# Altium footprint library cool_library.PcbLib: 1182 footprints (part 38 of 75)
Each footprint in its own frame and in the unit in brackets; x right, y up, seen from the top. Pads: shape width x height; smd on the part's side, far side on the other; paste and mask are expansions set on the pad; w line width, h text height; cw(c..) or ccw(c..) is an arc to the next point about the centre after c.
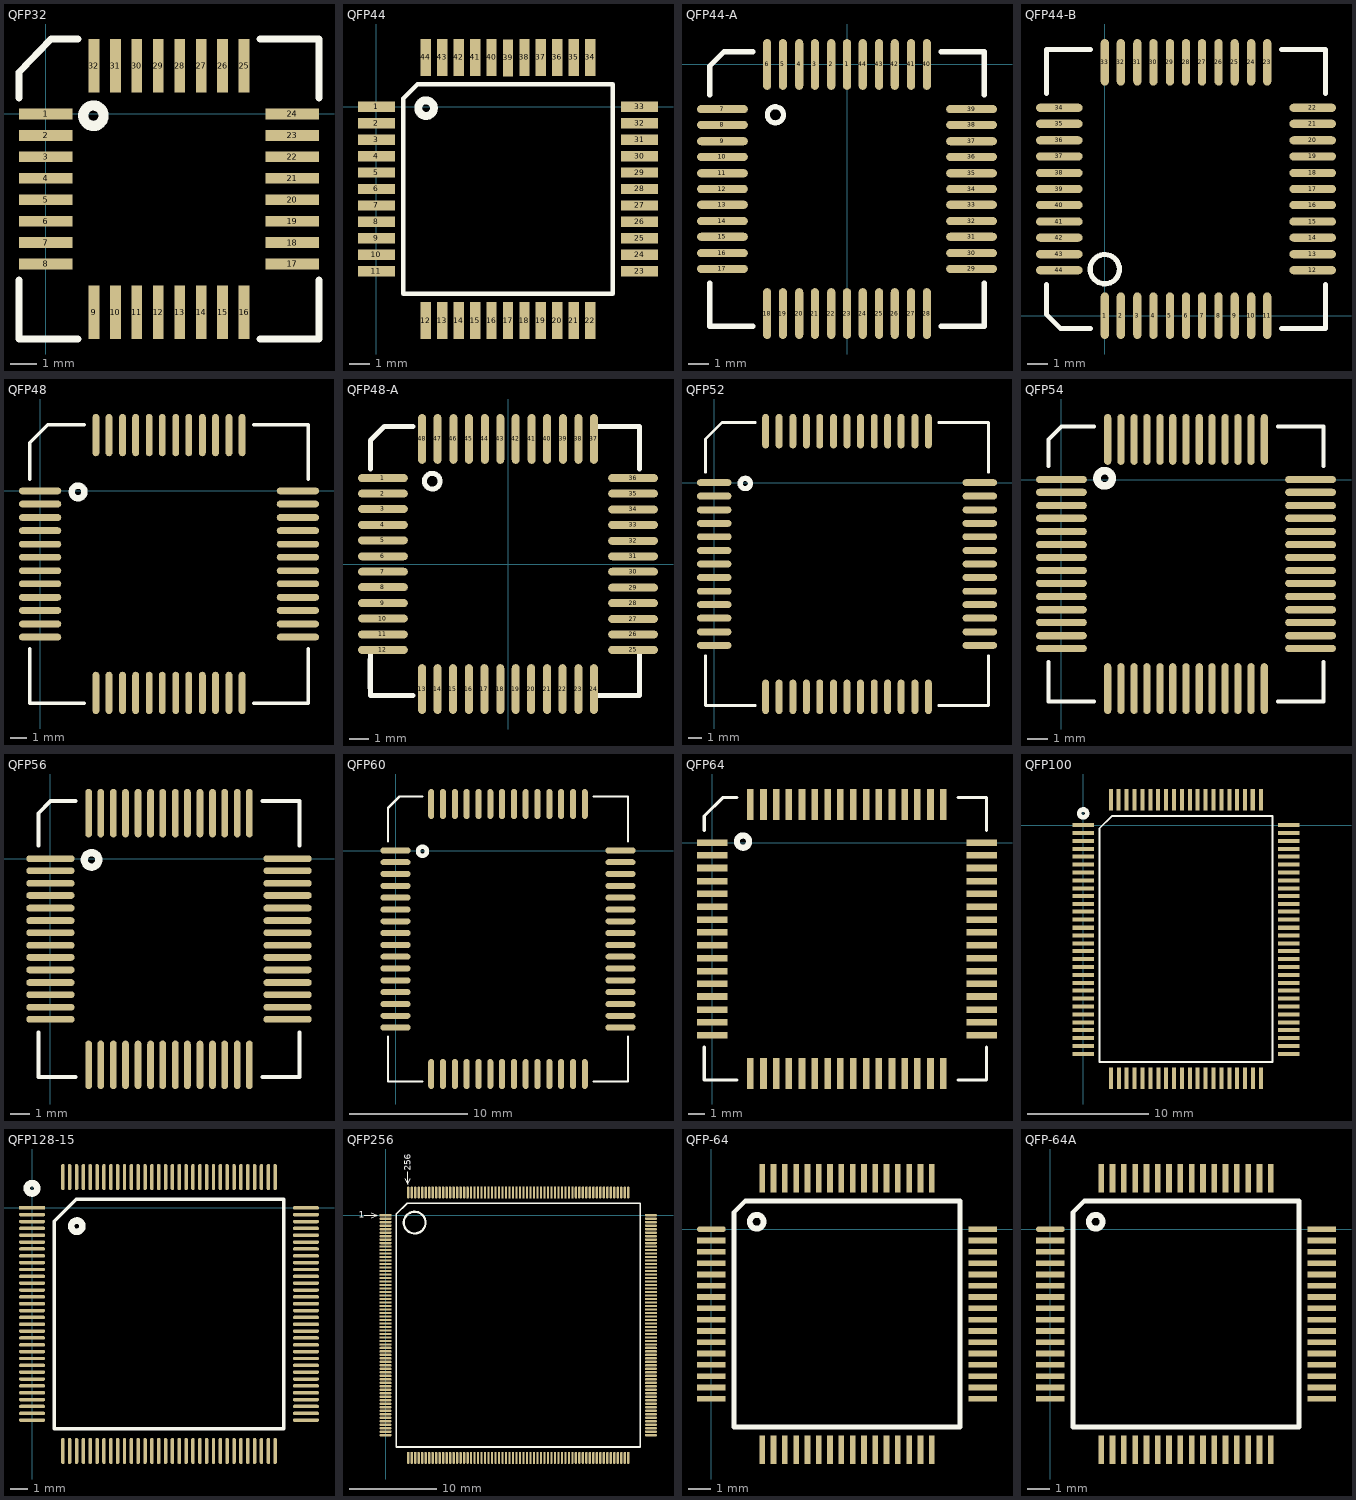
[diagram p37: the footprints below, top view; thin cyan lines are the x and y axes]

## QFP32 [mm]
pads (32):
  rect 2x0.4 smd: 1(0,0) 2(0,-0.8) 3(0,-1.6) 4(0,-2.4) 5(0,-3.2) 6(0,-4) 7(0,-4.8) 8(0,-5.6) 17(9.2,-5.6) 18(9.2,-4.8) 19(9.2,-4) 20(9.2,-3.2) 21(9.2,-2.4) 22(9.2,-1.6) 23(9.2,-0.8) 24(9.2,0)
  rect 0.4x2 smd: 9(1.8,-7.4) 10(2.6,-7.4) 11(3.4,-7.4) 12(4.2,-7.4) 13(5,-7.4) 14(5.8,-7.4) 15(6.6,-7.4) 16(7.4,-7.4) 25(7.4,1.8) 26(6.6,1.8) 27(5.8,1.8) 28(5,1.8) 29(4.2,1.8) 30(3.4,1.8) 31(2.6,1.8) 32(1.8,1.8)
Top Overlay:
  circle w0.381: c1.777,-0.063 r0.381
  lines w0.254: -1,-6.2 -1,-8.4 1.2,-8.4 ; -1,0.6 -1,1.556 0.19,2.8 1.2,2.8 ; 8,-8.4 10.2,-8.4 10.2,-6.2 ; 8,2.8 10.2,2.8 10.2,0.6

## QFP44 [mm]
pads (44):
  rect 1.8x0.5 smd: 1(0,0) 2(0,-0.8) 3(0,-1.6) 4(0,-2.4) 5(0,-3.2) 6(0,-4) 7(0,-4.8) 8(0,-5.6) 9(0,-6.4) 10(0,-7.2) 11(0,-8) 23(12.8,-8) 24(12.8,-7.2) 25(12.8,-6.4) 26(12.8,-5.6) 27(12.8,-4.8) 28(12.8,-4) 29(12.8,-3.2) 30(12.8,-2.4) 31(12.8,-1.6) 32(12.8,-0.8) 33(12.8,0)
  rect 0.5x1.8 smd: 12(2.4,-10.4) 13(3.2,-10.4) 14(4,-10.4) 15(4.8,-10.4) 16(5.6,-10.4) 17(6.4,-10.4) 18(7.2,-10.4) 19(8,-10.4) 20(8.8,-10.4) 21(9.6,-10.4) 22(10.4,-10.4) 34(10.4,2.4) 35(9.6,2.4) 36(8.8,2.4) 37(8,2.4) 38(7.2,2.4) 39(6.4,2.375) 40(5.6,2.4) 41(4.8,2.4) 42(4,2.4) 43(3.2,2.4) 44(2.4,2.4)
Top Overlay:
  circle w0.381: c2.412,-0.063 r0.381
  lines w0.203: 1.3,-9.1 1.3,0.411 1.989,1.1 11.5,1.1 11.5,-9.1 1.3,-9.1

## QFP44-A [mil]
pads (44):
  oval 16x100 smd: 1(0,0) 2(-31,0) 3(-63,0) 4(-94,0) 5(-126,0) 6(-157,0) 18(-157,-490) 19(-126,-490) 20(-94,-490) 21(-63,-490) 22(-31,-490) 23(0,-490) 24(31,-490) 25(63,-490) 26(94,-490) 27(126,-490) 28(157,-490) 40(157,0) 41(126,0) 42(94,0) 43(63,0) 44(31,0)
  oval 100x16 smd: 7(-245,-88) 8(-245,-119) 9(-245,-151) 10(-245,-182) 11(-245,-214) 12(-245,-245) 13(-245,-276) 14(-245,-308) 15(-245,-339) 16(-245,-371) 17(-245,-402) 29(245,-402) 30(245,-371) 31(245,-339) 32(245,-308) 33(245,-276) 34(245,-245) 35(245,-214) 36(245,-182) 37(245,-151) 38(245,-119) 39(245,-88)
Top Overlay:
  circle w10: c-140.81,-99 r15.81
  lines w10: -270,-430 -270,-515 -185,-515 ; -270,-60 -270,-3 -242,25 -185,25 ; 185,-515 270,-515 270,-430 ; 185,25 270,25 270,-60

## QFP44-B [mil]
pads (44):
  oval 16x90 smd: 1(0,0) 2(31,0) 3(63,0) 4(94,0) 5(126,0) 6(157,0) 7(188,0) 8(220,0) 9(251,0) 10(283,0) 11(314,0) 23(314,490) 24(283,490) 25(251,490) 26(220,490) 27(188,490) 28(157,490) 29(126,490) 30(94,490) 31(63,490) 32(31,490) 33(0,490)
  oval 90x16 smd: 12(402,88) 13(402,119) 14(402,151) 15(402,182) 16(402,214) 17(402,245) 18(402,276) 19(402,308) 20(402,339) 21(402,371) 22(402,402) 34(-88,402) 35(-88,371) 36(-88,339) 37(-88,308) 38(-88,276) 39(-88,245) 40(-88,214) 41(-88,182) 42(-88,151) 43(-88,119) 44(-88,88)
Top Overlay:
  circle w10: c0,90 r28.28
  lines w10: -113,60 -113,3 -85,-25 -28,-25 ; -113,430 -113,515 -28,515 ; 342,-25 427,-25 427,60 ; 342,515 427,515 427,430

## QFP48 [mil]
pads (48):
  oval 100x16 smd: 1(0,0) 2(0,-31) 3(0,-63) 4(0,-94) 5(0,-126) 6(0,-157) 7(0,-189) 8(0,-220) 9(0,-252) 10(0,-283) 11(0,-315) 12(0,-346) 25(610,-346) 26(610,-315) 27(610,-283) 28(610,-252) 29(610,-220) 30(610,-189) 31(610,-157) 32(610,-126) 33(610,-94) 34(610,-63) 35(610,-31) 36(610,0)
  oval 16x100 smd: 13(132,-478) 14(163,-478) 15(195,-478) 16(226,-478) 17(258,-478) 18(289,-478) 19(321,-478) 20(352,-478) 21(384,-478) 22(415,-478) 23(447,-478) 24(478,-478) 37(478,132) 38(447,132) 39(415,132) 40(384,132) 41(352,132) 42(321,132) 43(289,132) 44(258,132) 45(226,132) 46(195,132) 47(163,132) 48(132,132)
Top Overlay:
  circle w15: c89.97,-2.48 r15
  lines w8: -25,-374 -25,-503 104,-503 ; -25,28 -25,114 18,157 104,157 ; 506,-503 635,-503 635,-374 ; 506,157 635,157 635,28

## QFP48-A [mil]
pads (48):
  oval 100x16 smd: 1(-251.24,172.5) 2(-251.24,141.5) 3(-251.24,110.5) 4(-251.24,78.5) 5(-251.24,47.5) 6(-251.24,15.5) 7(-251.24,-15.5) 8(-251.24,-46.5) 9(-251.24,-78.5) 10(-251.24,-109.5) 11(-251.24,-141.5) 12(-251.24,-172.5) 25(251.24,-172.5) 26(251.24,-141.5) 27(251.24,-110.5) 28(251.24,-78.5) 29(251.24,-47.5) 30(251.24,-15.5) 31(251.24,15.5) 32(251.24,46.5) 33(251.24,78.5) 34(251.24,109.5) 35(251.24,141.5) 36(251.24,172.5)
  oval 16x100 smd: 13(-172.5,-251.24) 14(-141.5,-251.24) 15(-110.5,-251.24) 16(-78.5,-251.24) 17(-47.5,-251.24) 18(-15.5,-251.24) 19(15.5,-251.24) 20(46.5,-251.24) 21(78.5,-251.24) 22(109.5,-251.24) 23(141.5,-251.24) 24(172.5,-251.24) 37(172.5,251.24) 38(141.5,251.24) 39(110.5,251.24) 40(78.5,251.24) 41(47.5,251.24) 42(15.5,251.24) 43(-15.5,251.24) 44(-46.5,251.24) 45(-78.5,251.24) 46(-109.5,251.24) 47(-141.5,251.24) 48(-172.5,251.24)
Top Overlay:
  circle w10: c-152.05,166.24 r15.81
  lines w10: -276.24,-178.76 -276.24,-263.76 -191.24,-263.76 ; 178.76,-263.76 263.76,-263.76 263.76,-178.76 ; 178.76,276.24 263.76,276.24 263.76,191.24 ; -276.24,248.24 -276.24,191.24 -276.24,248.24 ; -276.24,248.24 -248.24,276.24 ; -248.24,276.24 -191.24,276.24 -248.24,276.24 ; -276.98,-248.76 -276.98,-191.76 -276.98,-248.76

## QFP52 [mil]
pads (52):
  oval 100x20 smd: 1(0,0) 2(0,-39) 3(0,-79) 4(0,-118) 5(0,-157) 6(0,-197) 7(0,-236) 8(0,-275) 9(0,-315) 10(0,-354) 11(0,-393) 12(0,-433) 13(0,-472) 27(770,-472) 28(770,-433) 29(770,-393) 30(770,-354) 31(770,-315) 32(770,-275) 33(770,-236) 34(770,-197) 35(770,-157) 36(770,-118) 37(770,-79) 38(770,-39) 39(770,0)
  oval 20x100 smd: 14(149,-621) 15(188,-621) 16(228,-621) 17(267,-621) 18(306,-621) 19(346,-621) 20(385,-621) 21(424,-621) 22(464,-621) 23(503,-621) 24(542,-621) 25(582,-621) 26(621,-621) 40(621,149) 41(582,149) 42(542,149) 43(503,149) 44(464,149) 45(424,149) 46(385,149) 47(346,149) 48(306,149) 49(267,149) 50(228,149) 51(188,149) 52(149,149)
Top Overlay:
  circle w15: c89.97,-2.48 r15
  lines w8: -25,-502 -25,-646 119,-646 ; -25,30 -25,126 23,174 119,174 ; 651,-646 795,-646 795,-502 ; 651,174 795,174 795,30

## QFP54 [mil]
pads (54):
  oval 100x14 smd: 1(0,0) 2(0,-25) 3(0,-51) 4(0,-76) 5(0,-102) 6(0,-128) 7(0,-153) 8(0,-179) 9(0,-204) 10(0,-230) 11(0,-256) 12(0,-281) 13(0,-307) 14(0,-332) 28(490,-332) 29(490,-307) 30(490,-281) 31(490,-256) 32(490,-230) 33(490,-204) 34(490,-179) 35(490,-153) 36(490,-128) 37(490,-102) 38(490,-76) 39(490,-51) 40(490,-25) 41(490,0)
  oval 14x100 smd: 15(91,-411) 16(117,-411) 17(143,-411) 18(168,-411) 19(194,-411) 20(219,-411) 21(245,-411) 22(271,-411) 23(296,-411) 24(322,-411) 25(347,-411) 26(373,-411) 27(399,-411) 42(399,79) 43(373,79) 44(347,79) 45(322,79) 46(296,79) 47(271,79) 48(245,79) 49(219,79) 50(194,79) 51(168,79) 52(143,79) 53(117,79) 54(91,79)
Top Overlay:
  circle w15: c84.97,2.52 r15
  lines w8: -25,-359 -25,-436 64,-436 ; -25,27 -25,79 0,104 64,104 ; 426,-436 515,-436 515,-359 ; 426,104 515,104 515,27

## QFP56 [mil]
pads (56):
  oval 100x14 smd: 1(0,0) 2(0,-25) 3(0,-51) 4(0,-76) 5(0,-102) 6(0,-128) 7(0,-153) 8(0,-179) 9(0,-204) 10(0,-230) 11(0,-256) 12(0,-281) 13(0,-307) 14(0,-332) 29(490,-332) 30(490,-307) 31(490,-281) 32(490,-256) 33(490,-230) 34(490,-204) 35(490,-179) 36(490,-153) 37(490,-128) 38(490,-102) 39(490,-76) 40(490,-51) 41(490,-25) 42(490,0)
  oval 14x100 smd: 15(79,-426) 16(104,-426) 17(130,-426) 18(155,-426) 19(181,-426) 20(207,-426) 21(232,-426) 22(258,-426) 23(283,-426) 24(309,-426) 25(335,-426) 26(360,-426) 27(386,-426) 28(411,-426) 43(411,94) 44(386,94) 45(360,94) 46(335,94) 47(309,94) 48(283,94) 49(258,94) 50(232,94) 51(207,94) 52(181,94) 53(155,94) 54(130,94) 55(104,94) 56(79,94)
Top Overlay:
  circle w15: c84.97,-2.48 r15
  lines w8: -25,-359 -25,-451 52,-451 ; -25,27 -25,94 0,119 52,119 ; 438,-451 515,-451 515,-359 ; 438,119 515,119 515,27

## QFP60 [mil]
pads (60):
  oval 100x20 smd: 1(0,0) 2(0,-39) 3(0,-78) 4(0,-118) 5(0,-157) 6(0,-197) 7(0,-236) 8(0,-275) 9(0,-315) 10(0,-354) 11(0,-393) 12(0,-433) 13(0,-472) 14(0,-512) 15(0,-551) 16(0,-590) 31(750,-590) 32(750,-551) 33(750,-512) 34(750,-472) 35(750,-433) 36(750,-393) 37(750,-354) 38(750,-315) 39(750,-275) 40(750,-236) 41(750,-197) 42(750,-157) 43(750,-118) 44(750,-78) 45(750,-39) 46(750,0)
  oval 20x100 smd: 17(119,-745) 18(158,-745) 19(198,-745) 20(237,-745) 21(277,-745) 22(316,-745) 23(355,-745) 24(395,-745) 25(434,-745) 26(473,-745) 27(513,-745) 28(552,-745) 29(592,-745) 30(631,-745) 47(631,155) 48(592,155) 49(552,155) 50(513,155) 51(473,155) 52(434,155) 53(395,155) 54(355,155) 55(316,155) 56(277,155) 57(237,155) 58(198,155) 59(158,155) 60(119,155)
Top Overlay:
  circle w15: c89.97,-2.48 r15
  lines w8: -25,-620 -25,-770 89,-770 ; -25,30 -25,142 13,180 89,180 ; 661,-770 775,-770 775,-620 ; 661,180 775,180 775,30

## QFP64 [mil]
pads (64):
  rect 75x16 smd: 1(0,0) 2(0,-31) 3(0,-62) 4(0,-94) 5(0,-125) 6(0,-157) 7(0,-188) 8(0,-219) 9(0,-251) 10(0,-282) 11(0,-314) 12(0,-345) 13(0,-376) 14(0,-408) 15(0,-439) 16(0,-471) 33(658,-471) 34(658,-439) 35(658,-408) 36(658,-376) 37(658,-345) 38(658,-314) 39(658,-282) 40(658,-251) 41(658,-219) 42(658,-188) 43(658,-157) 44(658,-125) 45(658,-94) 46(658,-62) 47(658,-31) 48(658,0)
  rect 16x75 smd: 17(93,-564) 18(125,-564) 19(156,-564) 20(187,-564) 21(219,-564) 22(250,-564) 23(282,-564) 24(313,-564) 25(344,-564) 26(376,-564) 27(407,-564) 28(439,-564) 29(470,-564) 30(501,-564) 31(533,-564) 32(564,-564) 49(564,93) 50(533,93) 51(501,93) 52(470,93) 53(439,93) 54(407,93) 55(376,93) 56(344,93) 57(313,93) 58(282,93) 59(250,93) 60(219,93) 61(187,93) 62(156,93) 63(125,93) 64(93,93)
Top Overlay:
  circle w15: c74.97,2.52 r15
  lines w8: -20,-500 -20,-580 60,-580 ; -20,30 -20,65 25,110 60,110 ; 600,-580 670,-580 670,-500 ; 600,110 670,110 670,30

## QFP100 [mil]
pads (100):
  rect 70x13 smd: 1(0,0) 2(0,-26) 3(0,-51) 4(0,-77) 5(0,-102) 6(0,-128) 7(0,-154) 8(0,-179) 9(0,-205) 10(0,-230) 11(0,-256) 12(0,-281) 13(0,-307) 14(0,-333) 15(0,-358) 16(0,-384) 17(0,-409) 18(0,-435) 19(0,-461) 20(0,-486) 21(0,-512) 22(0,-537) 23(0,-563) 24(0,-589) 25(0,-614) 26(0,-640) 27(0,-665) 28(0,-691) 29(0,-717) 30(0,-742) 51(667,-742) 52(667,-717) 53(667,-691) 54(667,-665) 55(667,-640) 56(667,-614) 57(667,-589) 58(667,-563) 59(667,-537) 60(667,-512) 61(667,-486) 62(667,-461) 63(667,-435) 64(667,-409) 65(667,-384) 66(667,-358) 67(667,-333) 68(667,-307) 69(667,-281) 70(667,-256) 71(667,-230) 72(667,-205) 73(667,-179) 74(667,-154) 75(667,-128) 76(667,-102) 77(667,-77) 78(667,-51) 79(667,-26) 80(667,0)
  rect 13x70 smd: 31(90,-821) 32(116,-821) 33(141,-821) 34(167,-821) 35(192,-821) 36(218,-821) 37(244,-821) 38(269,-821) 39(295,-821) 40(320,-821) 41(346,-821) 42(371,-821) 43(397,-821) 44(423,-821) 45(448,-821) 46(474,-821) 47(499,-821) 48(525,-821) 49(551,-821) 50(576,-821) 81(576,82) 82(550,82) 83(525,82) 84(499,82) 85(474,82) 86(448,82) 87(422,82) 88(397,82) 89(371,82) 90(346,82) 91(320,82) 92(295,82) 93(269,82) 94(243,82) 95(218,82) 96(192,82) 97(167,82) 98(141,82) 99(115,82) 100(90,82)
Top Overlay:
  circle w15: c0,38 r12.81
  lines w6: 614,-768 53,-768 53,-11 93,29 614,29 ; 614.05,-768.05 614.05,29.05

## QFP128-15 [mil]
pads (128):
  rect 60x8 smd: 1(0,0)
  oval 60x8 smd: 2(0,-15.75) 3(0,-31.5) 4(0,-47.24) 5(0,-62.99) 6(0,-78.74) 7(0,-94.49) 8(0,-110.24) 9(0,-125.98) 10(0,-141.73) 11(0,-157.48) 12(0,-173.23) 13(0,-188.98) 14(0,-204.72) 15(0,-220.47) 16(0,-236.22) 17(0,-251.97) 18(0,-267.72) 19(0,-283.46) 20(0,-299.21) 21(0,-314.96) 22(0,-330.71) 23(0,-346.46) 24(0,-362.2) 25(0,-377.95) 26(0,-393.7) 27(0,-409.45) 28(0,-425.2) 29(0,-440.94) 30(0,-456.69) 31(0,-472.44) 32(0,-488.19) 65(629.92,-488.19) 66(629.92,-472.44) 67(629.92,-456.69) 68(629.92,-440.94) 69(629.92,-425.2) 70(629.92,-409.45) 71(629.92,-393.7) 72(629.92,-377.95) 73(629.92,-362.2) 74(629.92,-346.46) 75(629.92,-330.71) 76(629.92,-314.96) 77(629.92,-299.21) 78(629.92,-283.46) 79(629.92,-267.72) 80(629.92,-251.97) 81(629.92,-236.22) 82(629.92,-220.47) 83(629.92,-204.72) 84(629.92,-188.98) 85(629.92,-173.23) 86(629.92,-157.48) 87(629.92,-141.73) 88(629.92,-125.98) 89(629.92,-110.24) 90(629.92,-94.49) 91(629.92,-78.74) 92(629.92,-62.99) 93(629.92,-47.24) 94(629.92,-31.5) 95(629.92,-15.75) 96(629.92,0)
  oval 8x60 smd: 33(70.87,-559.05) 34(86.61,-559.05) 35(102.36,-559.05) 36(118.11,-559.05) 37(133.86,-559.05) 38(149.61,-559.05) 39(165.35,-559.05) 40(181.1,-559.05) 41(196.85,-559.05) 42(212.6,-559.05) 43(228.35,-559.05) 44(244.09,-559.05) 45(259.84,-559.05) 46(275.59,-559.05) 47(291.34,-559.05) 48(307.09,-559.05) 49(322.83,-559.05) 50(338.58,-559.05) 51(354.33,-559.05) 52(370.08,-559.05) 53(385.83,-559.05) 54(401.57,-559.05) 55(417.32,-559.05) 56(433.07,-559.05) 57(448.82,-559.05) 58(464.57,-559.05) 59(480.31,-559.05) 60(496.06,-559.05) 61(511.81,-559.05) 62(527.56,-559.05) 63(543.31,-559.05) 64(559.05,-559.05) 97(559.05,70.87) 98(543.31,70.87) 99(527.56,70.87) 100(511.81,70.87) 101(496.06,70.87) 102(480.31,70.87) 103(464.57,70.87) 104(448.82,70.87) 105(433.07,70.87) 106(417.32,70.87) 107(401.57,70.87) 108(385.83,70.87) 109(370.08,70.87) 110(354.33,70.87) 111(338.58,70.87) 112(322.83,70.87) 113(307.09,70.87) 114(291.34,70.87) 115(275.59,70.87) 116(259.84,70.87) 117(244.09,70.87) 118(228.35,70.87) 119(212.6,70.87) 120(196.85,70.87) 121(181.1,70.87) 122(165.35,70.87) 123(149.61,70.87) 124(133.86,70.87) 125(118.11,70.87) 126(102.36,70.87) 127(86.61,70.87) 128(70.87,70.87)
Top Overlay:
  circle w15: c-0.03,45 r12.01
  circle w15: c102.97,-42 r12.97
  lines w7.87: 50.59,-508.46 50.59,-30.31 101.18,20.28 579.33,20.28 579.33,-508.46 50.59,-508.46

## QFP256 [mm]
pads (256):
  rect 1.4x0.26 smd: 1(0,0)
  oval 1.4x0.26 smd: 2(0,-0.4) 3(0,-0.8) 4(0,-1.2) 5(0,-1.6) 6(0,-2) 7(0,-2.4) 8(0,-2.8) 9(0,-3.2) 10(0,-3.6) 11(0,-4) 12(0,-4.4) 13(0,-4.8) 14(0,-5.2) 15(0,-5.6) 16(0,-6) 17(0,-6.4) 18(0,-6.8) 19(0,-7.2) 20(0,-7.6) 21(0,-8) 22(0,-8.4) 23(0,-8.8) 24(0,-9.2) 25(0,-9.6) 26(0,-10) 27(0,-10.4) 28(0,-10.8) 29(0,-11.2) 30(0,-11.6) 31(0,-12) 32(0,-12.4) 33(0,-12.8) 34(0,-13.2) 35(0,-13.6) 36(0,-14) 37(0,-14.4) 38(0,-14.8) 39(0,-15.2) 40(0,-15.6) 41(0,-16) 42(0,-16.4) 43(0,-16.8) 44(0,-17.2) 45(0,-17.6) 46(0,-18) 47(0,-18.4) 48(0,-18.8) 49(0,-19.2) 50(0,-19.6) 51(0,-20) 52(0,-20.4) 53(0,-20.8) 54(0,-21.2) 55(0,-21.6) 56(0,-22) 57(0,-22.4) 58(0,-22.8) 59(0,-23.2) 60(0,-23.6) 61(0,-24) 62(0,-24.4) 63(0,-24.8) 64(0,-25.2) 129(30.4,-25.2) 130(30.4,-24.8) 131(30.4,-24.4) 132(30.4,-24) 133(30.4,-23.6) 134(30.4,-23.2) 135(30.4,-22.8) 136(30.4,-22.4) 137(30.4,-22) 138(30.4,-21.6) 139(30.4,-21.2) 140(30.4,-20.8) 141(30.4,-20.4) 142(30.4,-20) 143(30.4,-19.6) 144(30.4,-19.2) 145(30.4,-18.8) 146(30.4,-18.4) 147(30.4,-18) 148(30.4,-17.6) 149(30.4,-17.2) 150(30.4,-16.8) 151(30.4,-16.4) 152(30.4,-16) 153(30.4,-15.6) 154(30.4,-15.2) 155(30.4,-14.8) 156(30.4,-14.4) 157(30.4,-14) 158(30.4,-13.6) 159(30.4,-13.2) 160(30.4,-12.8) 161(30.4,-12.4) 162(30.4,-12) 163(30.4,-11.6) 164(30.4,-11.2) 165(30.4,-10.8) 166(30.4,-10.4) 167(30.4,-10) 168(30.4,-9.6) 169(30.4,-9.2) 170(30.4,-8.8) 171(30.4,-8.4) 172(30.4,-8) 173(30.4,-7.6) 174(30.4,-7.2) 175(30.4,-6.8) 176(30.4,-6.4) 177(30.4,-6) 178(30.4,-5.6) 179(30.4,-5.2) 180(30.4,-4.8) 181(30.4,-4.4) 182(30.4,-4) 183(30.4,-3.6) 184(30.4,-3.2) 185(30.4,-2.8) 186(30.4,-2.4) 187(30.4,-2) 188(30.4,-1.6) 189(30.4,-1.2) 190(30.4,-0.8) 191(30.4,-0.4) 192(30.4,0)
  oval 0.26x1.4 smd: 65(2.6,-27.8) 66(3,-27.8) 67(3.4,-27.8) 68(3.8,-27.8) 69(4.2,-27.8) 70(4.6,-27.8) 71(5,-27.8) 72(5.4,-27.8) 73(5.8,-27.8) 74(6.2,-27.8) 75(6.6,-27.8) 76(7,-27.8) 77(7.4,-27.8) 78(7.8,-27.8) 79(8.2,-27.8) 80(8.6,-27.8) 81(9,-27.8) 82(9.4,-27.8) 83(9.8,-27.8) 84(10.2,-27.8) 85(10.6,-27.8) 86(11,-27.8) 87(11.4,-27.8) 88(11.8,-27.8) 89(12.2,-27.8) 90(12.6,-27.8) 91(13,-27.8) 92(13.4,-27.8) 93(13.8,-27.8) 94(14.2,-27.8) 95(14.6,-27.8) 96(15,-27.8) 97(15.4,-27.8) 98(15.8,-27.8) 99(16.2,-27.8) 100(16.6,-27.8) 101(17,-27.8) 102(17.4,-27.8) 103(17.8,-27.8) 104(18.2,-27.8) 105(18.6,-27.8) 106(19,-27.8) 107(19.4,-27.8) 108(19.8,-27.8) 109(20.2,-27.8) 110(20.6,-27.8) 111(21,-27.8) 112(21.4,-27.8) 113(21.8,-27.8) 114(22.2,-27.8) 115(22.6,-27.8) 116(23,-27.8) 117(23.4,-27.8) 118(23.8,-27.8) 119(24.2,-27.8) 120(24.6,-27.8) 121(25,-27.8) 122(25.4,-27.8) 123(25.8,-27.8) 124(26.2,-27.8) 125(26.6,-27.8) 126(27,-27.8) 127(27.4,-27.8) 128(27.8,-27.8) 193(27.8,2.6) 194(27.4,2.6) 195(27,2.6) 196(26.6,2.6) 197(26.2,2.6) 198(25.8,2.6) 199(25.4,2.6) 200(25,2.6) 201(24.6,2.6) 202(24.2,2.6) 203(23.8,2.6) 204(23.4,2.6) 205(23,2.6) 206(22.6,2.6) 207(22.2,2.6) 208(21.8,2.6) 209(21.4,2.6) 210(21,2.6) 211(20.6,2.6) 212(20.2,2.6) 213(19.8,2.6) 214(19.4,2.6) 215(19,2.6) 216(18.6,2.6) 217(18.2,2.6) 218(17.8,2.6) 219(17.4,2.6) 220(17,2.6) 221(16.6,2.6) 222(16.2,2.6) 223(15.8,2.6) 224(15.4,2.6) 225(15,2.6) 226(14.6,2.6) 227(14.2,2.6) 228(13.8,2.6) 229(13.4,2.6) 230(13,2.6) 231(12.6,2.6) 232(12.2,2.6) 233(11.8,2.6) 234(11.4,2.6) 235(11,2.6) 236(10.6,2.6) 237(10.2,2.6) 238(9.8,2.6) 239(9.4,2.6) 240(9,2.6) 241(8.6,2.6) 242(8.2,2.6) 243(7.8,2.6) 244(7.4,2.6) 245(7,2.6) 246(6.6,2.6) 247(6.2,2.6) 248(5.8,2.6) 249(5.4,2.6) 250(5,2.6) 251(4.6,2.6) 252(4.2,2.6) 253(3.8,2.6) 254(3.4,2.6) 255(3,2.6) 256(2.6,2.6)
Top Overlay:
  circle w0.254: c3.333,-0.85 r1.247
  lines w0.127: -2.44,0 -0.97,0 ; -1.62,-0.32 -0.97,0 ; -1.62,0.29 -0.97,0 ; 2.22,4.18 2.54,3.53 ; 2.54,5 2.54,3.53 ; 2.83,4.18 2.54,3.53
  lines w0.2: 1.235,-26.565 29.165,-26.565 29.165,1.365 2.47,1.365 1.235,0.13 1.235,-26.565
  text "1" at -3.05,-0.32 h0.76
  text "256" at 2.91,5.1 h0.76

## QFP-64 [mil]
pads (64):
  oval 50x10 smd: 1(0,0)
  rect 50x10 smd: 2(0,-19.69) 3(0,-39.37) 4(0,-59.06) 5(0,-78.74) 6(0,-98.43) 7(0,-118.11) 8(0,-137.8) 9(0,-157.48) 10(0,-177.17) 11(0,-196.85) 12(0,-216.54) 13(0,-236.22) 14(0,-255.91) 15(0,-275.59) 16(0,-295.28) 33(472.44,-295.28) 34(472.44,-275.59) 35(472.44,-255.91) 36(472.44,-236.22) 37(472.44,-216.54) 38(472.44,-196.85) 39(472.44,-177.17) 40(472.44,-157.48) 41(472.44,-137.8) 42(472.44,-118.11) 43(472.44,-98.43) 44(472.44,-78.74) 45(472.44,-59.06) 46(472.44,-39.37) 47(472.44,-19.69) 48(472.44,0)
  rect 10x50 smd: 17(88.58,-383.86) 18(108.27,-383.86) 19(127.95,-383.86) 20(147.64,-383.86) 21(167.32,-383.86) 22(187.01,-383.86) 23(206.69,-383.86) 24(226.38,-383.86) 25(246.06,-383.86) 26(265.75,-383.86) 27(285.43,-383.86) 28(305.12,-383.86) 29(324.8,-383.86) 30(344.49,-383.86) 31(364.17,-383.86) 32(383.86,-383.86) 49(383.86,88.58) 50(364.17,88.58) 51(344.49,88.58) 52(324.8,88.58) 53(305.12,88.58) 54(285.43,88.58) 55(265.75,88.58) 56(246.06,88.58) 57(226.38,88.58) 58(206.69,88.58) 59(187.01,88.58) 60(167.32,88.58) 61(147.64,88.58) 62(127.95,88.58) 63(108.27,88.58) 64(88.58,88.58)
Top Overlay:
  circle w10: c78.96,13 r12.04
  lines w8: 39.37,-344.49 433.07,-344.49 433.07,49.21 59.05,49.21 39.37,29.53 39.37,-344.49

## QFP-64A [mil]
pads (64):
  oval 50x10 smd: 1(0,0)
  rect 50x10 smd: 2(0,-19.69) 3(0,-39.37) 4(0,-59.06) 5(0,-78.74) 6(0,-98.43) 7(0,-118.11) 8(0,-137.8) 9(0,-157.48) 10(0,-177.17) 11(0,-196.85) 12(0,-216.54) 13(0,-236.22) 14(0,-255.91) 15(0,-275.59) 16(0,-295.28) 33(472.44,-295.28) 34(472.44,-275.59) 35(472.44,-255.91) 36(472.44,-236.22) 37(472.44,-216.54) 38(472.44,-196.85) 39(472.44,-177.17) 40(472.44,-157.48) 41(472.44,-137.8) 42(472.44,-118.11) 43(472.44,-98.43) 44(472.44,-78.74) 45(472.44,-59.06) 46(472.44,-39.37) 47(472.44,-19.69) 48(472.44,0)
  rect 10x50 smd: 17(88.58,-383.86) 18(108.27,-383.86) 19(127.95,-383.86) 20(147.64,-383.86) 21(167.32,-383.86) 22(187.01,-383.86) 23(206.69,-383.86) 24(226.38,-383.86) 25(246.06,-383.86) 26(265.75,-383.86) 27(285.43,-383.86) 28(305.12,-383.86) 29(324.8,-383.86) 30(344.49,-383.86) 31(364.17,-383.86) 32(383.86,-383.86) 49(383.86,88.58) 50(364.17,88.58) 51(344.49,88.58) 52(324.8,88.58) 53(305.12,88.58) 54(285.43,88.58) 55(265.75,88.58) 56(246.06,88.58) 57(226.38,88.58) 58(206.69,88.58) 59(187.01,88.58) 60(167.32,88.58) 61(147.64,88.58) 62(127.95,88.58) 63(108.27,88.58) 64(88.58,88.58)
Top Overlay:
  circle w10: c78.96,13 r12.04
  lines w8: 39.37,-344.49 39.37,29.53 59.05,49.21 433.07,49.21 433.07,-344.49 39.37,-344.49